# Altium footprint library Connectors.PcbLib: 158 footprints (part 6 of 10)
Each footprint in its own frame and in the unit in brackets; x right, y up, seen from the top. Pads: shape width x height; smd on the part's side, far side on the other; paste and mask are expansions set on the pad; w line width, h text height; cw(c..) or ccw(c..) is an arc to the next point about the centre after c.
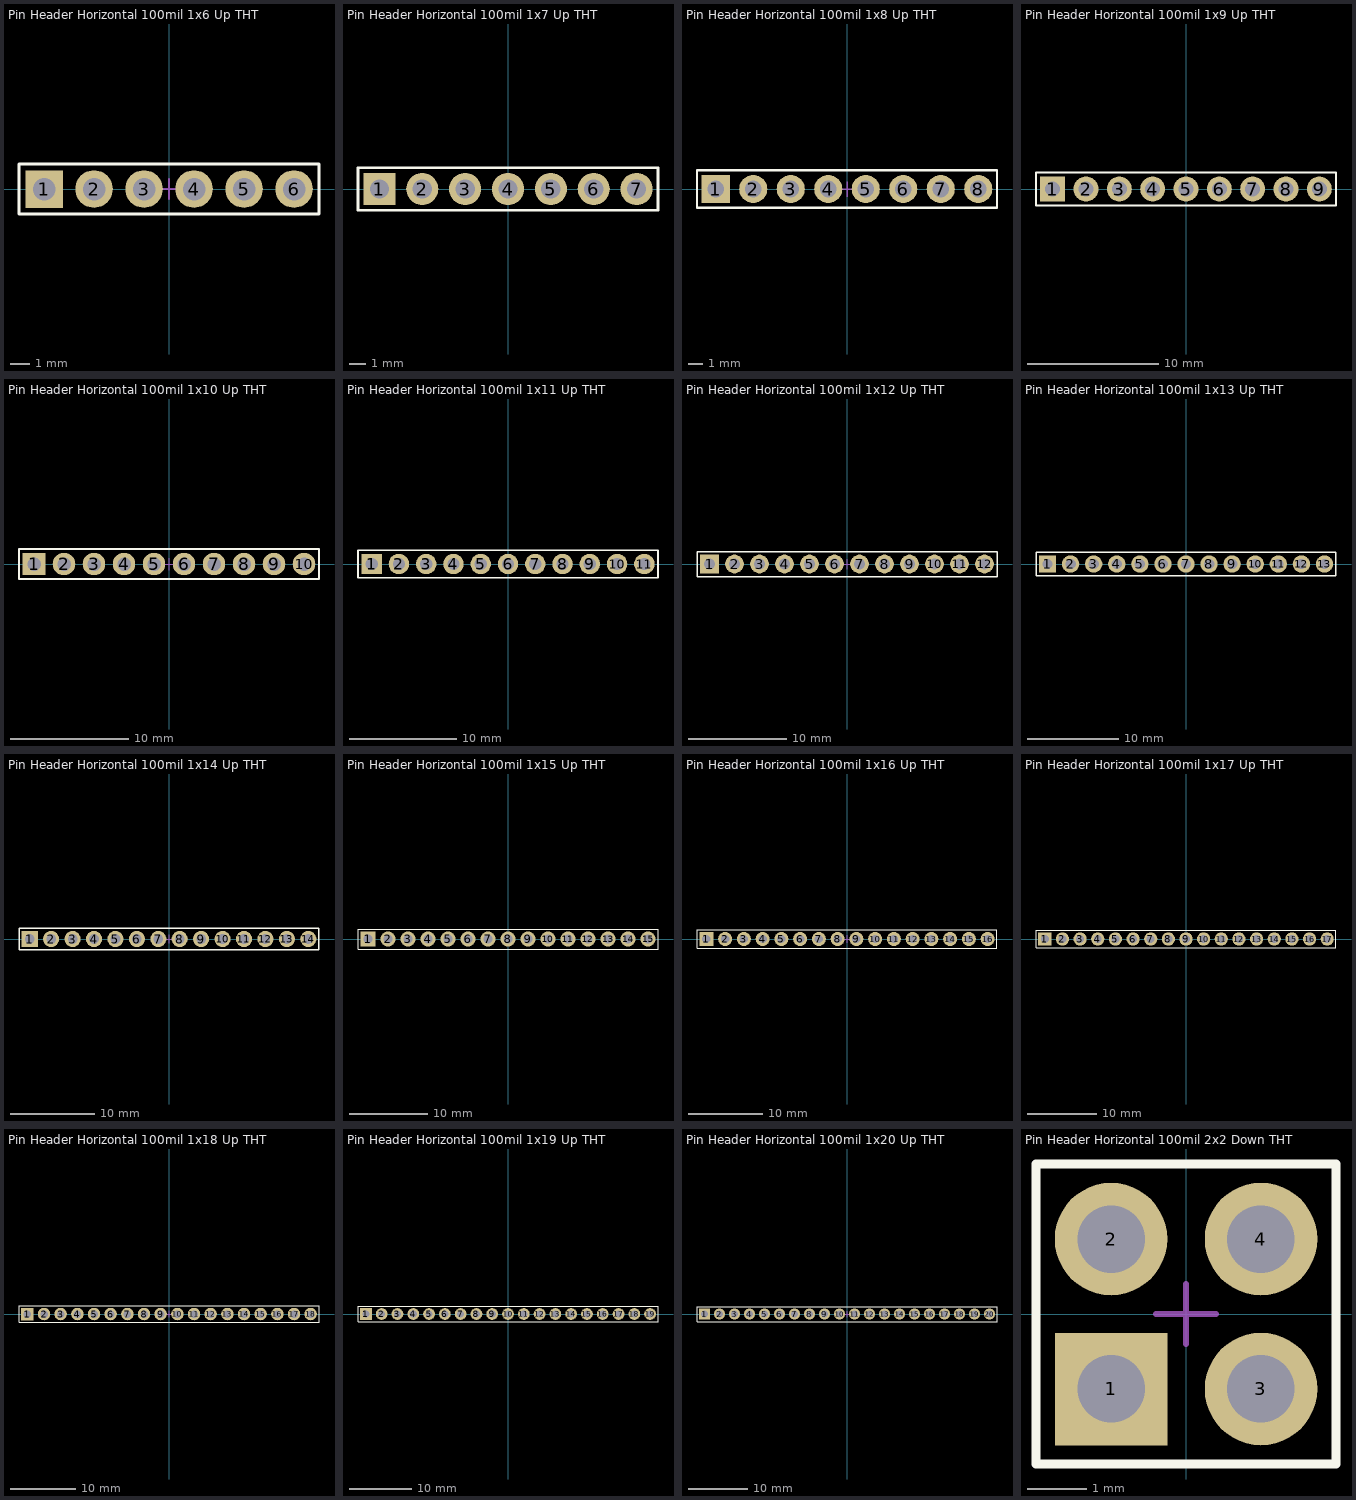
[diagram p5: the footprints below, top view; thin cyan lines are the x and y axes]

## Pin Header Horizontal 100mil 1x6 Up THT [mil]
pads (6):
  rect 75x75 hole 45: 1(-250,0)
  round 75 hole 45: 2(-150,0) 3(-50,0) 4(50,0) 5(150,0) 6(250,0)
Top Overlay:
  lines w6: -300,-50 -300,50 300,50 300,-50 -300,-50
Mechanical 15:
  lines w4: -20,0 20,0 ; 0,-20 0,20
3D body "pin_header_horizontal_male_100mil_1x6_THT.stp": height 101, standoff -117.11, extent -300,-11.65 300,396.22

## Pin Header Horizontal 100mil 1x7 Up THT [mil]
pads (7):
  rect 75x75 hole 45: 1(-300,0)
  round 75 hole 45: 2(-200,0) 3(-100,0) 4(0,0) 5(100,0) 6(200,0) 7(300,0)
Top Overlay:
  lines w6: -350,-50 -350,50 350,50 350,-50 -350,-50
Mechanical 15:
  lines w4: -20,0 20,0 ; 0,-20 0,20
3D body "pin_header_horizontal_male_100mil_1x7_THT.stp": height 101, standoff -117.11, extent -350,-11.65 350,396.22

## Pin Header Horizontal 100mil 1x8 Up THT [mil]
pads (8):
  rect 75x75 hole 45: 1(-350,0)
  round 75 hole 45: 2(-250,0) 3(-150,0) 4(-50,0) 5(50,0) 6(150,0) 7(250,0) 8(350,0)
Top Overlay:
  lines w6: -400,-50 -400,50 400,50 400,-50 -400,-50
Mechanical 15:
  lines w4: -20,0 20,0 ; 0,-20 0,20
3D body "pin_header_horizontal_male_100mil_1x8_THT.stp": height 101, standoff -117.11, extent -400,-11.65 400,396.22

## Pin Header Horizontal 100mil 1x9 Up THT [mil]
pads (9):
  rect 75x75 hole 45: 1(-400,0)
  round 75 hole 45: 2(-300,0) 3(-200,0) 4(-100,0) 5(0,0) 6(100,0) 7(200,0) 8(300,0) 9(400,0)
Top Overlay:
  lines w6: -450,-50 450,-50 450,50 -450,50 -450,-50
Mechanical 15:
  lines w4: -20,0 20,0 ; 0,-20 0,20
3D body "pin_header_horizontal_male_100mil_1x9_THT.stp": height 101, standoff -117.11, extent -450,-11.65 450,396.22

## Pin Header Horizontal 100mil 1x10 Up THT [mil]
pads (10):
  rect 75x75 hole 45: 1(-450,0)
  round 75 hole 45: 2(-350,0) 3(-250,0) 4(-150,0) 5(-50,0) 6(50,0) 7(150,0) 8(250,0) 9(350,0) 10(450,0)
Top Overlay:
  lines w6: -500,-50 -500,50 500,50 500,-50 -500,-50
Mechanical 15:
  lines w4: -20,0 20,0 ; 0,-20 0,20
3D body "pin_header_horizontal_male_100mil_1x10_THT.stp": height 101, standoff -117.11, extent -500,-11.65 500,396.22

## Pin Header Horizontal 100mil 1x11 Up THT [mil]
pads (11):
  rect 75x75 hole 45: 1(-500,0)
  round 75 hole 45: 2(-400,0) 3(-300,0) 4(-200,0) 5(-100,0) 6(0,0) 7(100,0) 8(200,0) 9(300,0) 10(400,0) 11(500,0)
Top Overlay:
  lines w6: -550,-50 550,-50 550,50 -550,50 -550,-50
Mechanical 15:
  lines w4: -20,0 20,0 ; 0,-20 0,20
3D body "pin_header_horizontal_male_100mil_1x6_THT.stp": height 101, standoff -117.11, extent -50,-11.65 550,396.22
3D body "pin_header_horizontal_male_100mil_1x5_THT.stp": height 101, standoff -117.11, extent -550,-11.65 -50,396.22

## Pin Header Horizontal 100mil 1x12 Up THT [mil]
pads (12):
  rect 75x75 hole 45: 1(-550,0)
  round 75 hole 45: 2(-450,0) 3(-350,0) 4(-250,0) 5(-150,0) 6(-50,0) 7(50,0) 8(150,0) 9(250,0) 10(350,0) 11(450,0) 12(550,0)
Top Overlay:
  lines w6: -600,-50 600,-50 600,50 -600,50 -600,-50
Mechanical 15:
  lines w4: -20,0 20,0 ; 0,-20 0,20
3D body "pin_header_horizontal_male_100mil_1x12_THT.stp": height 101, standoff -117.11, extent -600,-11.65 600,396.22

## Pin Header Horizontal 100mil 1x13 Up THT [mil]
pads (13):
  rect 75x75 hole 45: 1(-600,0)
  round 75 hole 45: 2(-500,0) 3(-400,0) 4(-300,0) 5(-200,0) 6(-100,0) 7(0,0) 8(100,0) 9(200,0) 10(300,0) 11(400,0) 12(500,0) 13(600,0)
Top Overlay:
  lines w6: -650,-50 -650,50 650,50 650,-50 -650,-50
Mechanical 15:
  lines w4: -20,0 20,0 ; 0,-20 0,20
3D body "pin_header_horizontal_male_100mil_1x7_THT.stp": height 101, standoff -117.11, extent -50,-11.65 650,396.22
3D body "pin_header_horizontal_male_100mil_1x6_THT.stp": height 101, standoff -117.11, extent -650,-11.65 -50,396.22

## Pin Header Horizontal 100mil 1x14 Up THT [mil]
pads (14):
  rect 75x75 hole 45: 1(-650,0)
  round 75 hole 45: 2(-550,0) 3(-450,0) 4(-350,0) 5(-250,0) 6(-150,0) 7(-50,0) 8(50,0) 9(150,0) 10(250,0) 11(350,0) 12(450,0) 13(550,0) 14(650,0)
Top Overlay:
  lines w6: -700,-50 700,-50 700,50 -700,50 -700,-50
Mechanical 15:
  lines w4: -20,0 20,0 ; 0,-20 0,20
3D body "pin_header_horizontal_male_100mil_1x14_THT.stp": height 101, standoff -117.11, extent -700,-11.66 700,396.22

## Pin Header Horizontal 100mil 1x15 Up THT [mil]
pads (15):
  rect 75x75 hole 45: 1(-700,0)
  round 75 hole 45: 2(-600,0) 3(-500,0) 4(-400,0) 5(-300,0) 6(-200,0) 7(-100,0) 8(0,0) 9(100,0) 10(200,0) 11(300,0) 12(400,0) 13(500,0) 14(600,0) 15(700,0)
Top Overlay:
  lines w6: -750,-50 -750,50 750,50 750,-50 -750,-50
Mechanical 15:
  lines w4: -20,0 20,0 ; 0,-20 0,20
3D body "pin_header_horizontal_male_100mil_1x7_THT.stp": height 101, standoff -117.11, extent -750,-11.65 -50,396.22
3D body "pin_header_horizontal_male_100mil_1x8_THT.stp": height 101, standoff -117.11, extent -50,-11.65 750,396.22

## Pin Header Horizontal 100mil 1x16 Up THT [mil]
pads (16):
  rect 75x75 hole 45: 1(-750,0)
  round 75 hole 45: 2(-650,0) 3(-550,0) 4(-450,0) 5(-350,0) 6(-250,0) 7(-150,0) 8(-50,0) 9(50,0) 10(150,0) 11(250,0) 12(350,0) 13(450,0) 14(550,0) 15(650,0) 16(750,0)
Top Overlay:
  lines w6: -800,-50 800,-50 800,50 -800,50 -800,-50
Mechanical 15:
  lines w4: -20,0 20,0 ; 0,-20 0,20
3D body "pin_header_horizontal_male_100mil_1x16_THT.stp": height 101, standoff -117.11, extent -800,-11.65 800,396.22

## Pin Header Horizontal 100mil 1x17 Up THT [mil]
pads (17):
  rect 75x75 hole 45: 1(-800,0)
  round 75 hole 45: 2(-700,0) 3(-600,0) 4(-500,0) 5(-400,0) 6(-300,0) 7(-200,0) 8(-100,0) 9(0,0) 10(100,0) 11(200,0) 12(300,0) 13(400,0) 14(500,0) 15(600,0) 16(700,0) 17(800,0)
Top Overlay:
  lines w6: -850,-50 850,-50 850,50 -850,50 -850,-50
Mechanical 15:
  lines w4: -20,0 20,0 ; 0,-20 0,20
3D body "pin_header_horizontal_male_100mil_1x9_THT.stp": height 101, standoff -117.11, extent -50,-13.65 850,394.22
3D body "pin_header_horizontal_male_100mil_1x8_THT.stp": height 101, standoff -117.11, extent -850.01,-13.32 -50.01,394.56

## Pin Header Horizontal 100mil 1x18 Up THT [mil]
pads (18):
  rect 75x75 hole 45: 1(-850,0)
  round 75 hole 45: 2(-750,0) 3(-650,0) 4(-550,0) 5(-450,0) 6(-350,0) 7(-250,0) 8(-150,0) 9(-50,0) 10(50,0) 11(150,0) 12(250,0) 13(350,0) 14(450,0) 15(550,0) 16(650,0) 17(750,0) 18(850,0)
Top Overlay:
  lines w6: -900,-50 900,-50 900,50 -900,50 -900,-50
Mechanical 15:
  lines w4: -20,0 20,0 ; 0,-20 0,20
3D body "pin_header_horizontal_male_100mil_1x18_THT.stp": height 101, standoff -117.11, extent -900,-11.66 900,396.22

## Pin Header Horizontal 100mil 1x19 Up THT [mil]
pads (19):
  rect 75x75 hole 45: 1(-900,0)
  round 75 hole 45: 2(-800,0) 3(-700,0) 4(-600,0) 5(-500,0) 6(-400,0) 7(-300,0) 8(-200,0) 9(-100,0) 10(0,0) 11(100,0) 12(200,0) 13(300,0) 14(400,0) 15(500,0) 16(600,0) 17(700,0) 18(800,0) 19(900,0)
Top Overlay:
  lines w6: -950,-50 -950,50 950,50 950,-50 -950,-50
Mechanical 15:
  lines w4: -20,0 20,0 ; 0,-20 0,20
3D body "pin_header_horizontal_male_100mil_1x9_THT.stp": height 101, standoff -117.11, extent -950,-11.65 -50,396.22
3D body "pin_header_horizontal_male_100mil_1x10_THT.stp": height 101, standoff -117.11, extent -50,-11.65 950,396.22

## Pin Header Horizontal 100mil 1x20 Up THT [mil]
pads (20):
  rect 75x75 hole 45: 1(-950,0)
  round 75 hole 45: 2(-850,0) 3(-750,0) 4(-650,0) 5(-550,0) 6(-450,0) 7(-350,0) 8(-250,0) 9(-150,0) 10(-50,0) 11(50,0) 12(150,0) 13(250,0) 14(350,0) 15(450,0) 16(550,0) 17(650,0) 18(750,0) 19(850,0) 20(950,0)
Top Overlay:
  lines w6: -1000,-50 -1000,50 1000,50 1000,-50 -1000,-50
Mechanical 15:
  lines w4: -20,0 20,0 ; 0,-20 0,20
3D body "pin_header_horizontal_male_100mil_1x2_THT.stp": height 101, standoff -117.11, extent 800,-11.65 1000,396.22
3D body "pin_header_horizontal_male_100mil_1x18_THT.stp": height 101, standoff -117.11, extent -1000,-11.65 800,396.22

## Pin Header Horizontal 100mil 2x2 Down THT [mil]
pads (4):
  rect 75x75 hole 45: 1(-50,-50)
  round 75 hole 45: 2(-50,50) 3(50,-50) 4(50,50)
Top Overlay:
  lines w6: -100,-100 100,-100 100,100 -100,100 -100,-100
Mechanical 15:
  lines w4: -20,0 20,0 ; 0,-20 0,20
3D body "pin_header_horizontal_100mil_2x2_THT.stp": height 201, standoff -117.11, extent -100,-443.94 100,63.94